# Altium footprint library THU VIEN PCB.PCBLib: 911 footprints (part 3 of 57)
Each footprint in its own frame and in the unit in brackets; x right, y up, seen from the top. Pads: shape width x height; smd on the part's side, far side on the other; paste and mask are expansions set on the pad; w line width, h text height; cw(c..) or ccw(c..) is an arc to the next point about the centre after c.
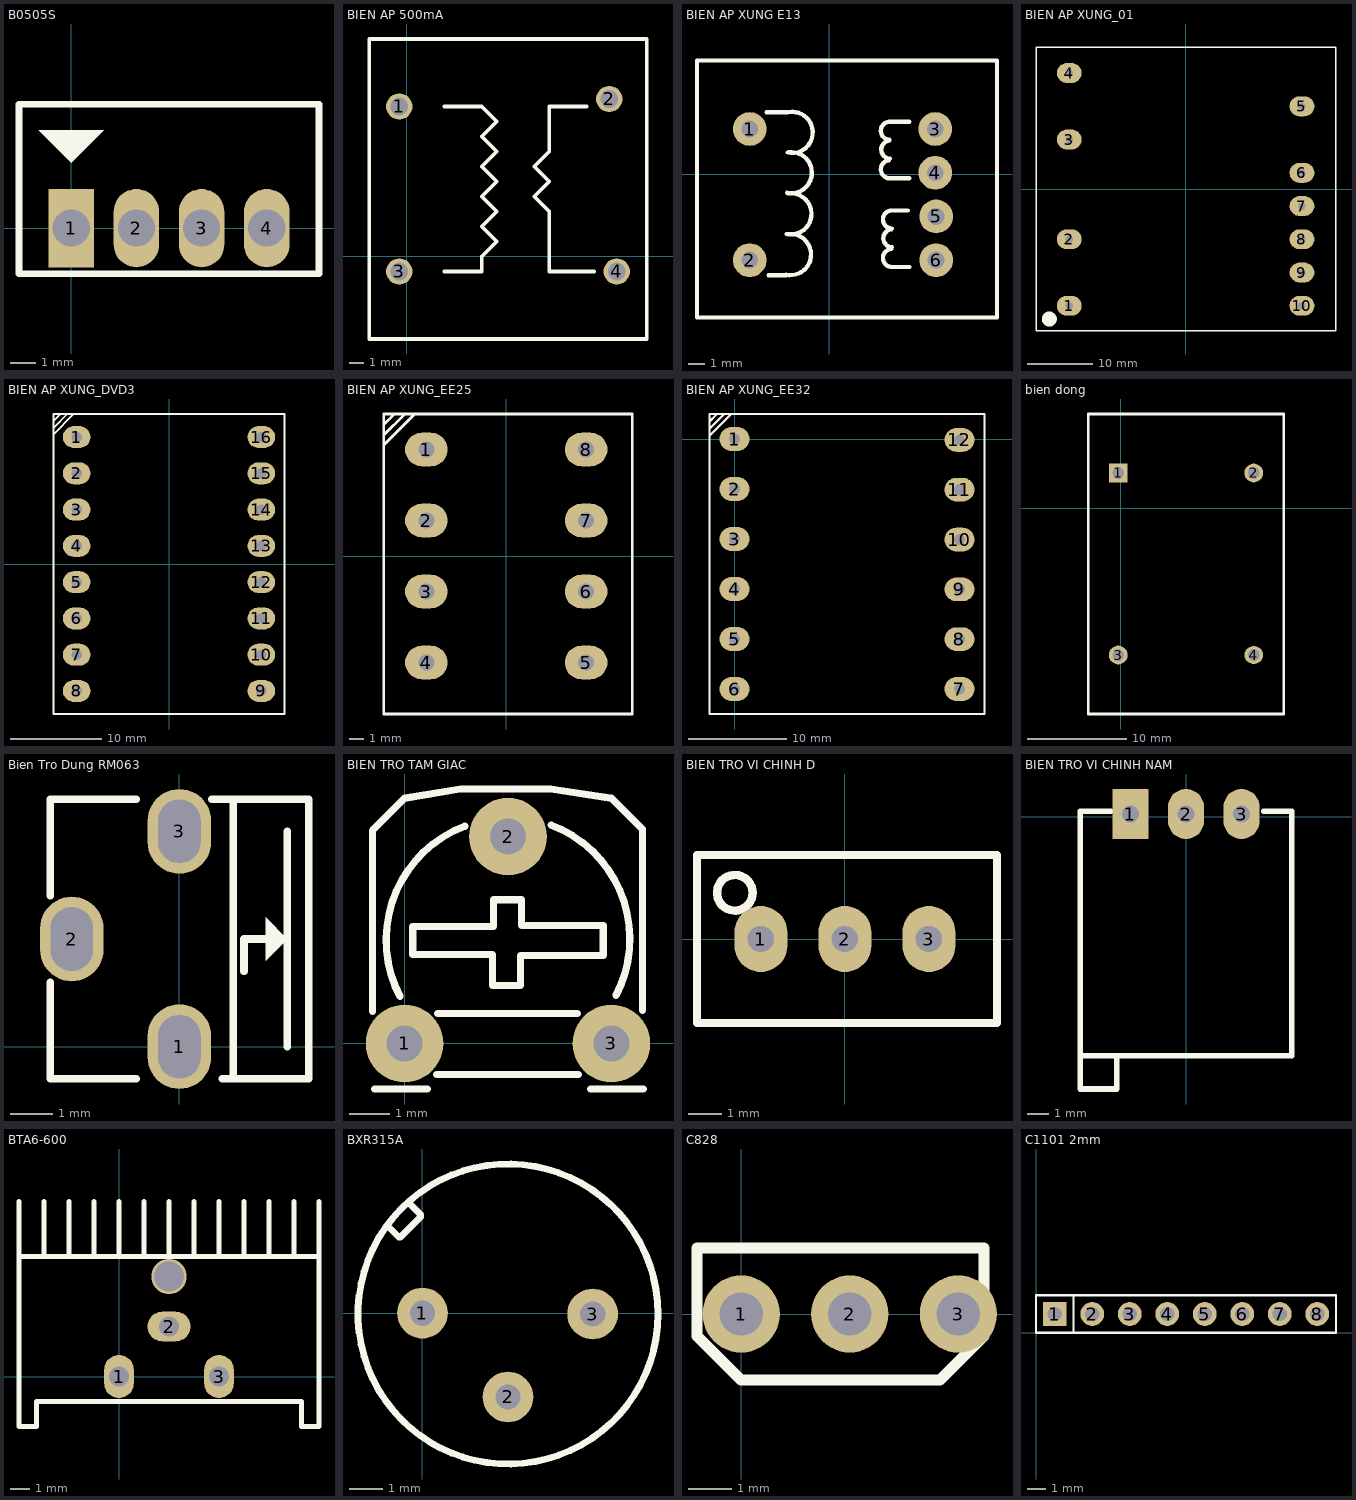
[diagram p2: the footprints below, top view; thin cyan lines are the x and y axes]

## B0505S [mil]
pads (4):
  rect 70x120 hole 57: 1(0,0)
  oval 70x120 hole 57: 2(100,0) 3(200,0) 4(300,0)
Top Overlay:
  region: -50,150 50,150 0,100
  lines w10: -80,-70 -80,-60 -80,190 380,190 380,-70 -80,-70
3D body "B0505s.step": height 393.7, standoff -141.73, extent -76.38,-50 376.38,186.22

## BIEN AP 500mA [mil]
pads (4):
  round 70 hole 47.24 unplated: 1(-20,400) 2(540,420) 3(-20,-40) 4(560,-40)
Top Overlay:
  lines w10: 100,-40 200,-40 200,0 240,40 200,80 240,120 200,160 240,200 200,240 240,280 200,320 240,360 200,400 100,400 ; 480,400 380,400 380,280 340,240 380,200 340,160 380,120 380,-40 500,-40 ; -100,-220 640,-220 640,580 -100,580 -100,-220

## BIEN AP XUNG E13 [mm]
pads (6):
  round 2 hole 1: 1(-4.699,2.692) 2(-4.699,-5.08) 3(6.299,2.692) 4(6.299,0.102) 5(6.35,-2.489) 6(6.35,-5.08)
Top Overlay:
  lines w0.254: -3.708,3.683 -2.438,3.683 ; -3.581,-5.969 -2.54,-5.969 ; -2.54,-5.944 ccw(c-2.286,-4.75) -2.451,-3.54 ; -2.515,-3.531 ccw(c-2.261,-2.337) -2.426,-1.127 ; -2.489,-1.092 ccw(c-2.235,0.102) -2.4,1.311 ; -2.438,1.295 ccw(c-2.184,2.489) -2.349,3.699 ; 3.556,0.838 ccw(c3.607,0.305) 3.584,-0.231 ; 3.556,3.124 ccw(c3.607,2.591) 3.584,2.055 ; 3.581,2.007 ccw(c3.632,1.473) 3.609,0.938 ; 3.581,3.124 4.75,3.124 ; 3.607,-0.229 4.75,-0.229 ; 3.683,-4.42 ccw(c3.734,-4.953) 3.711,-5.488 ; 3.683,-2.134 ccw(c3.734,-2.667) 3.711,-3.202 ; 3.708,-3.251 ccw(c3.759,-3.785) 3.736,-4.32 ; 3.708,-2.134 4.674,-2.134 ; 3.734,-5.486 4.775,-5.486 ; -7.823,-8.484 -7.823,6.756 9.957,6.756 9.957,-8.484 -7.823,-8.484

## BIEN AP XUNG_01 [mil] "Bien ap xung cho nguon T9AT"
pads (10):
  oval 150x120 hole 45: 1(-700,-700) 2(-700,-300) 3(-700,300) 4(-700,700) 5(700,500) 6(700,100) 7(700,-100) 8(700,-300) 9(700,-500) 10(700,-700)
Top Overlay:
  circle w50: c-820,-780 r20
  lines w8: -900,-850 -900,855 905,855 905,-850 -900,-850

## BIEN AP XUNG_DVD3 [mil] "Bien ap xung DVD3"
pads (16):
  oval 120x95 hole 45: 1(-400,550) 2(-400,392.86) 3(-400,235.71) 4(-400,78.57) 5(-400,-78.57) 6(-400,-235.71) 7(-400,-392.86) 8(-400,-550) 9(400,-550) 10(400,-392.86) 11(400,-235.71) 12(400,-78.57) 13(400,78.57) 14(400,235.71) 15(400,392.86) 16(400,550)
Top Overlay:
  lines w8: -500,563 -414,649 ; -500,589 -500,591 -442,649 ; -500,618 -500,620 -471,649 ; -500,-650 -500,650 490,650 500,650 500,-650 -500,-650

## BIEN AP XUNG_EE25 [mil] "EE25"
pads (8):
  oval 120x95 hole 45: 1(-225,300) 2(-225,100) 3(-225,-100) 4(-225,-300) 5(225,-300) 6(225,-100) 7(225,100) 8(225,300)
Top Overlay:
  lines w8: -345,313 -259,399 ; -345,339 -345,341 -287,399 ; -345,368 -345,370 -316,399 ; -345,-445 355,-445 355,400 -345,400 -345,-445

## BIEN AP XUNG_EE32 [mil] "EE32"
pads (12):
  oval 120x95 hole 45: 1(0,0) 2(0,-200) 3(0,-400) 4(0,-600) 5(0,-800) 6(0,-1000) 7(900,-1000) 8(900,-800.71) 9(900,-601.43) 10(900,-402.14) 11(900,-202.86) 12(900,-3.57)
Top Overlay:
  lines w8: -100,13 -14,99 ; -100,39 -100,41 -42,99 ; -100,68 -100,70 -71,99 ; -100,-1100 1000,-1100 1000,100 -100,100 -100,-1100

## bien dong [mm] "4 pin"
height 100
pads (4):
  rect 1.9x1.9 hole 1.2: 1(-0.254,3.556)
  round 1.9 hole 1.2: 2(13.462,3.556) 3(-0.254,-14.859)
  oval 1.9x1.79 hole 1.2: 4(13.462,-14.859)
Top Overlay:
  lines w0.254: -3.302,-20.828 -3.302,-20.32 -3.302,-19.685 -3.302,9.525 16.51,9.525 16.51,-20.828 ; -3.302,-20.828 16.51,-20.828 ; -3.302,-20.828 16.51,-20.828

## Bien Tro Dung RM063 [mm]
pads (3):
  oval 1.5x2 hole 1 slot 1.5 at 90 deg: 1(0,0) 2(-2.54,2.54) 3(0,5.08)
Top Overlay:
  region: 2.032,3.048 2.032,2.032 2.54,2.54
  lines w0.178: -3.048,1.524 -3.048,-0.762 -1.016,-0.762 ; -3.048,3.556 -3.048,5.842 -1.016,5.842 ; 0.762,5.842 3.048,5.842 3.048,-0.762 1.016,-0.762 ; 1.27,-0.762 1.27,5.842 ; 1.524,1.778 1.524,2.54 2.032,2.54 ; 2.54,0 2.54,5.08
3D body "User Library-RM-063.STEP": height 9.5, standoff -1.81, extent -2.683,-0.71 2.946,5.79

## BIEN TRO TAM GIAC [mil] "Resistor Variable"
height 200
pads (3):
  round 75 hole 35: 1(0,0) 2(100,200) 3(200,0)
Top Overlay:
  lines w7: -31,31 -31,206 0,237 54,246 141.5,246 200,237 230,207 230,32 ; -29,-44 22,-44 ; -4.35,45.34 cw(c100,100) 58.1,210.1 ; 8,113 8,86 85,86 85,56 112,56 112,85 192,85 192,114 113,114 113,139 86,139 86,113 9,113 ; 31,-30 168,-30 ; 32,29 167,29 ; 141.9,211.1 cw(c100,101) 204.35,46.34 ; 180,-44 231,-44
3D body "Bien TroTam Giac.step": height 278.74, standoff -150.39, extent -27.95,-49.68 227.95,227.88

## BIEN TRO VI CHINH D [mm] "Bien tro vi chinh"
pads (3):
  oval 1.6x2 hole 0.8: 1(-2.54,0) 2(0,0) 3(2.54,0)
Top Overlay:
  circle w0.254: c-3.327,1.397 r0.539
  lines w0.254: -4.47,-2.54 4.597,-2.54 4.597,2.54 -4.47,2.54 -4.47,-2.54
3D body "User Library-Potenciometro Vertical.step": height 12.02, standoff -5.48, extent -4.537,-2.4 4.663,2.4

## BIEN TRO VI CHINH NAM [mil]
pads (3):
  rect 65x90 hole 30: 1(-100,5)
  oval 65x90 hole 30: 2(0,5) 3(100,5)
Top Overlay:
  lines w10: -190,-455 -190,10 -135,10 ; -125,-430 -125,-490 -190,-490 -190,-430 190,-430 190,10 140,10
3D body "SW3dPS-Bourns_3299W.STEP": height 225.6, standoff -14.4, extent -187.5,-490 187.5,10

## BTA6-600 [mm] "TRIAC BTA6/6A/600V"
pads (4):
  oval 1.5x2.2 hole 1: 1(0,0) 3(5.08,0)
  oval 2.2x1.5 hole 1: 2(2.54,2.54)
  round 1.8 hole 1.5: ""(2.54,5.08)
Top Overlay:
  lines w0.254: -5.08,6.096 10.16,6.096 ; -5.08,8.89 -5.08,-2.54 -4.191,-2.54 -4.191,-1.27 9.271,-1.27 9.271,-2.54 10.16,-2.54 10.16,8.89 ; -3.81,6.096 -3.81,8.89 ; -2.54,6.096 -2.54,8.89 ; -1.27,6.096 -1.27,8.89 ; 0,6.096 0,8.89 ; 1.27,6.096 1.27,8.89 ; 2.54,6.096 2.54,8.89 ; 3.81,6.096 3.81,8.89 ; 5.08,6.096 5.08,8.89 ; 6.35,6.096 6.35,8.89 ; 7.62,6.096 7.62,8.89 ; 8.89,6.096 8.89,8.89
3D body "User Library-Disipador TO.step": height 20, standoff 0, extent -5.96,2.54 11.04,12.54
3D body "User Library-TO-220-3.step": height 18.7, standoff -10.08, extent -2.41,-2.083 7.49,2.417

## BXR315A [mil] "Xtal for RF"
pads (3):
  round 60 hole 30: 1(0,0) 2(101,-99) 3(201,-1)
Top Overlay:
  circle w8: c101,-1 r177.17
  lines w8: -41,103 -28,90 -26,90 -2,114 -2,116 -15,129

## C828 [mil]
pads (3):
  round 70 hole 39.37 unplated: 1(0,0) 2(98.43,0) 3(196.85,0)
Top Overlay:
  lines w10: -40,-20 -40,60 180,60 220,60 220,-20 180,-60 140,-60 0,-60 -40,-20

## C1101 2mm [mm]
pads (8):
  rect 1.27x1.27 hole 0.762: 1(1,1)
  round 1.27 hole 0.762: 2(3,1) 3(5,1) 4(7,1) 5(9,1) 6(11,1) 7(13,1) 8(15,1)
Top Overlay:
  lines w0.127: 2,0 2,2 ; 0,0 0,2 16,2 16,0 0,0
3D body: height 1.5, standoff 0, extent -0.01,0 2,2
3D body: height 1.5, standoff 0, extent 1.985,-0.01 3.995,1.99
3D body: height 1.5, standoff 0, extent 3.995,-0.03 6.005,1.97
3D body: height 1.5, standoff 0, extent 5.985,-0.02 7.995,1.98
3D body: height 1.5, standoff 0, extent 7.985,0.01 9.995,2.01
3D body: height 1.5, standoff 0, extent 9.995,0.01 12.005,2.01
3D body: height 1.5, standoff 0, extent 12.005,0.01 14.015,2.01
3D body: height 1.5, standoff 0, extent 14.005,0 16.015,2
3D body: height 7, standoff -1, extent 0.602,0.611 1.399,1.409
3D body: height 7, standoff -1, extent 2.744,0.684 3.54,1.482
3D body: height 7, standoff -1, extent 4.724,0.684 5.52,1.482
3D body: height 7, standoff -1, extent 6.724,0.704 7.52,1.502
3D body: height 7, standoff -1, extent 8.734,0.684 9.53,1.482
3D body: height 7, standoff -1, extent 10.724,0.674 11.52,1.472
3D body: height 7, standoff -1, extent 12.704,0.674 13.5,1.472
3D body: height 7, standoff -1, extent 14.744,0.684 15.54,1.482